# Altium integrated library OMID_DXP_LIB93.IntLib: 684 symbols (part 1 of 5)
Pins are listed as number, name and electrical type; pins without a type are passive.

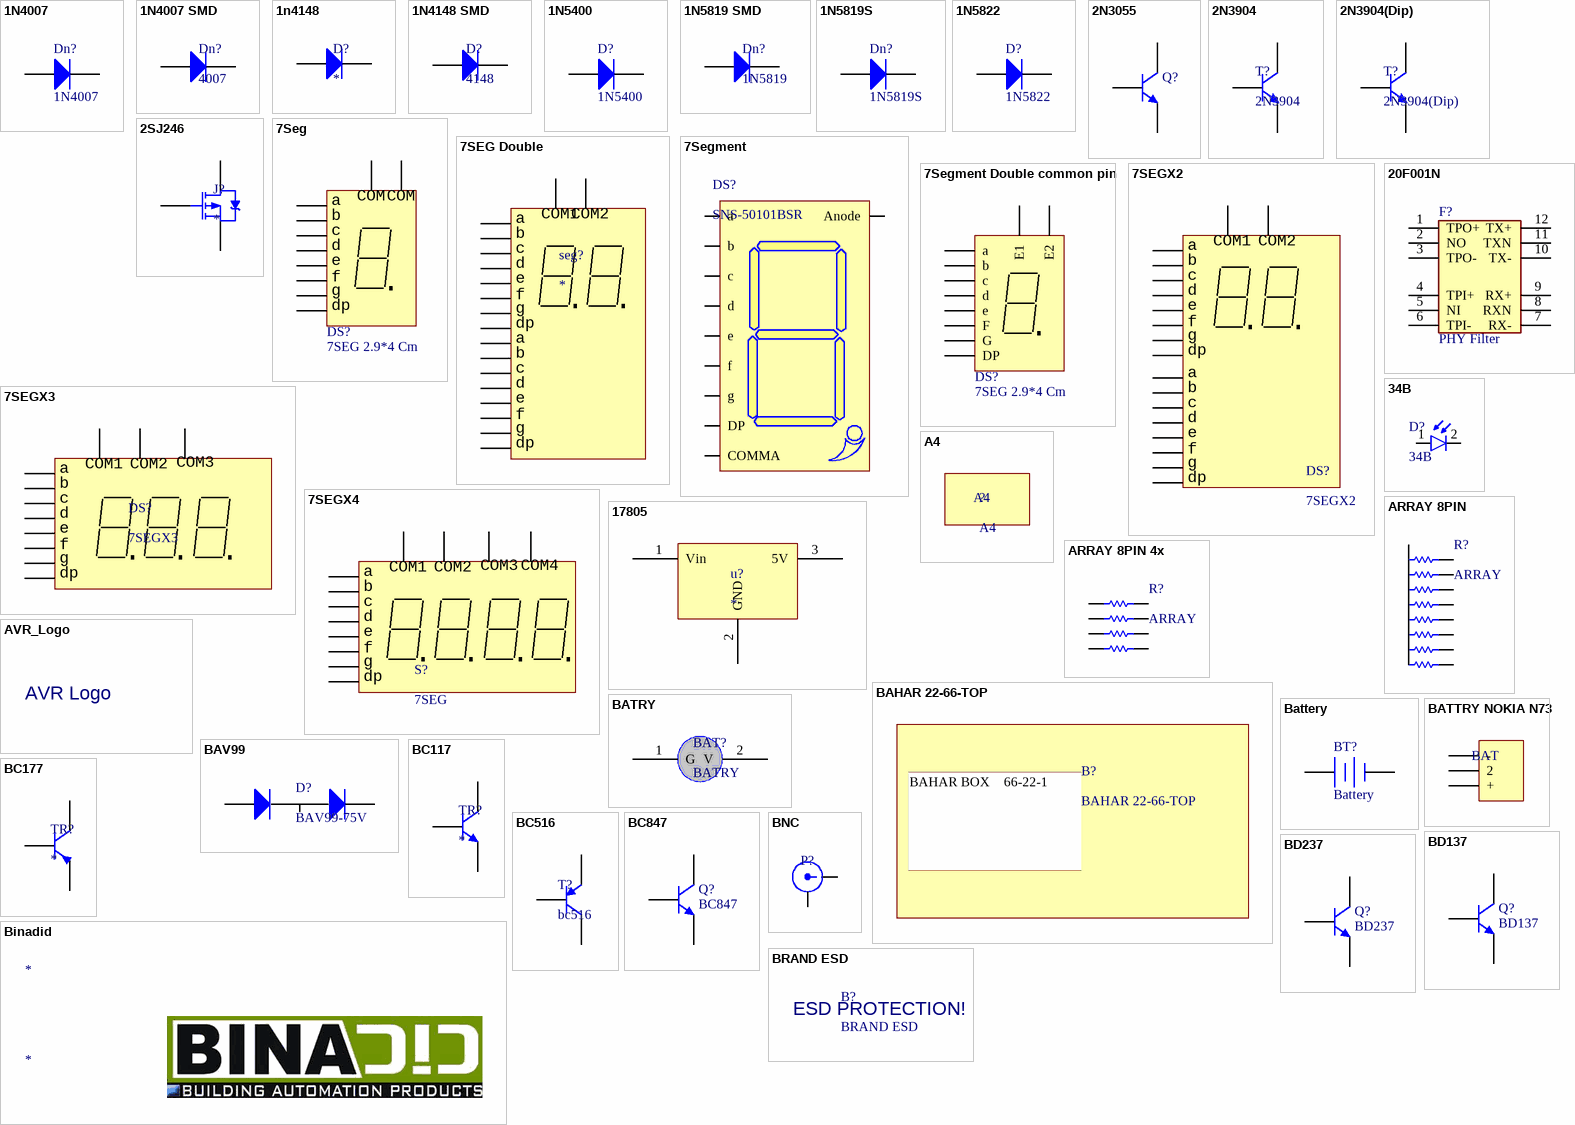
[diagram p0: symbols 1N4007 to BRAND ESD]

## 1N4007
designator Dn?
1 Amp Diode
footprint my_1n4148
footprint Diode 1N4007_Stand
footprint Diode-1n4001
pins: 1 A, 2 K

## 1N4007 SMD
designator Dn?, comment 4007
footprint my_smd_diode
footprint LL4148 (MELF Diode, 2-Leads, Body 3.5x1.4mm, IPC Medium Density)
footprint DO-214AB
footprint DO-214AA
pins: 1 A, 2 K

## 1n4148
designator D?
FAST DIODE
footprint DO-35 (Diode, Axial; Body 3.8 x 1.9 mm (LxDia. max), Lead Dia. 0.53 mm (max))
footprint DIO10.2-7x2.7 (Diode, Axial; Body 7 x 2.7 mm (LxDia. max), Lead Dia. 0.53 mm (max))
footprint Diode 1W_Stand
footprint Diode-1n4148-Stand
pins: 1 A, 2 K

## 1N4148 SMD
designator D?, comment 4148
FAST DIODE (SMD PACKAGE) 1N4148
footprint SOD80 (SOD80 SMD PACKAGE)
footprint LL4148 (MELF Diode, 2-Leads, Body 3.5x1.4mm, IPC Medium Density)
pins: 1 A, 2 K

## 1N5400
designator D?
3 Amp Diode
footprint My_DO201-15
pins: A, K

## 1N5819 SMD
designator Dn?, comment 1N5819
VERY FAST DIODE
footprint my_smd_diode
pins: 1 A, 2 K

## 1N5819S
designator Dn?
VERY FAST 1 AMP DIODE
footprint my_1n4148
footprint Diode 1N4007_Stand
footprint Diode-1n4001
pins: 1 A, 2 K

## 1N5822
designator D?
3 Amp Diode
footprint My_DO201-15
pins: A, K

## 2N3055
designator Q?
Complementary Silicon Power NPN Transistor, 15 Amp, 60 Volts and 115 Watts; Published: 19-Mar-2004; DatasheetVersion: 1984; PackageVersion: Rev.3, 1984; PackageReference: 11-01; Publisher: Altium Limited; PackageDescription: Oval Flange Mount with (2) Offset Leads; Pin Spacing 10.93 mm; Lead Dia. 1.09 mm (max); Code_JEDEC: TO-3; ComponentLink1Description: Manufacturer Link; ComponentLink1URL: http://www.onsemi.com/site/products/landing?taxonomyID=194
footprint 11-01 (Oval Flange Mount with (2) Offset Leads; Pin Spacing 10.93 mm; Lead Dia. 1.09 mm (max))
signal-integrity model 2N3055
pins: 1 B, 2 E, 3 C

## 2N3904
designator T?
footprint SOT23_BEC_N (SOT23, 3-Leads, Body 2.9x1.3mm, Pitch 0.95mm, Lead Span 2.4mm, IPC Medium Density)
footprint SOT23_BEC_L (SOT23, 3-Leads, Body 2.9x1.3mm, Pitch 0.95mm, Lead Span 2.4mm, IPC High Density)
footprint SOT23_BEC_M (SOT23, 3-Leads, Body 2.9x1.3mm, Pitch 0.95mm, Lead Span 2.4mm, IPC Low Density)
pins: 1 B, 2 E, 3 C

## 2N3904(Dip)
designator T?
footprint my_tr
pins: 1 E, 2 C, 3 B

## 2SJ246
designator J?
footprint my_smd_lf33
pins: 1 G, 2 D, 3 S

## 7Seg
designator DS?, comment 7SEG 2.9*4 Cm
Common Anode Seven-Segment Display, Right Hand Decimal; Manufacturer: Generic Components; Class: Optoelectronic; SubClass: LED Display; Published: 08/06/2000; Publisher: Altium Hobart Technology Centre
footprint My_7 seg_BIG
footprint 7Segment
footprint 7SEGMENT_MEDIUM
pins: 1 COM (power), 2 e, 3 d, 4 c, 5 COM (power), 6 b, 7 a, 8 dp, 9 f, 10 g

## 7SEG Double
designator seg?
footprint my_7seg_double
pins: 1 f, 2 g, 3 a, 4 b, 5 COM1 (power), 6 COM2 (power), 7 f, 8 a, 9 b, 10 e, 11 d, 12 c, 13 dp, 14 e, 15 d, 16 g, 17 c, 18 dp

## 7Segment
designator DS?, comment SNS-50101BSR
footprint 7Segment
pins: 1 e, 2 d, 3 COMMA, 4 DP, 5 c, 6 b, 7 a, 8 Anode, 9 g, 10 f

## 7Segment Double common pin
designator DS?, comment 7SEG 2.9*4 Cm
Common Anode Seven-Segment Display, Right Hand Decimal; Manufacturer: Generic Components; Class: Optoelectronic; SubClass: LED Display; Published: 08/06/2000; Publisher: Altium Hobart Technology Centre
footprint 7segx2 COMMON PIN (cuade 7seg in 1 package)
pins: 1 d, 2 DP, 3 e, 4 c, 5 E2 (power), 6 b, 7 a, 8 F, 9 G, 10 E1 (power)

## 7SEGX2
designator DS?
LITE ON COMPANY 7SEGMENT NUMERIC LED DISPLAY
footprint 7segx2 (cuade 7seg in 1 package)
pins: 1 e, 2 d, 3 c, 4 dp, 5 e, 6 d, 7 g, 8, 9 dp, 10 b, 11 a, 12 f, 13 COM2 (power), 14 COM1 (power), 15 b, 16 a, 17 g, 18 f

## 7SEGX3
designator DS?
LITE ON COMPANY 7SEGMENT NUMERIC LED DISPLAY
footprint 7SEGX3
pins: 1 e, 2 d, 3 dp, 4 c, 5 g, 7 b, 8 COM1 (power), 9 COM2 (power), 10 f, 11 a, 12 COM1 (power)
text: COM3

## 7SEGX4
designator S?, comment 7SEG
LITE ON COMPANY 7SEGMENT NUMERIC LED DISPLAY
footprint 7SEGX4
pins: 1 e, 2 d, 3 dp, 4 c, 5 g, 6 COM2 (power), 7 b, 8 COM1 (power), 9 COM2 (power), 10 f, 11 a, 12 COM1 (power)
text: COM3; COM4

## 20F001N
designator F?, comment PHY Filter
footprint MY_20F001N
pins: 1 TPO+, 2 NO, 3 TPO-, 4 TPI+, 5 NI, 6 TPI-, 7 RX-, 8 RXN, 9 RX+, 10 TX-, 11 TXN, 12 TX+

## 34B
designator D?
Photodiode; Designer: Saeid Jorablo; Company: Personal; Project Name: Laser; Adding Date: 10/21/2009
footprint 34b
pins: 1 A, 2 K

## 17805
designator u?
5 V 1 AMPER (LONG INPUT BANDWITH)
footprint my_smd_lf33
footprint my_7805
pins: 1 Vin (power), 2 GND (power), 3 5V (power)

## A4
designator ?
A4 PAPAR SIZE
footprint A4

## ARRAY 8PIN
designator R?, comment ARRAY
8 PIN ARRAY RESISTOR; VALUE?: 47K
footprint MY1X9
pins: 1, 2, 3, 4, 5, 6, 7, 8, 9

## ARRAY 8PIN 4x
designator R?, comment ARRAY
8 PIN ARRAY RESISTOR; VALUE?: 47K
footprint Res Array 0603X4 3.2mmX1.6mm
footprint RES ARRAY 1206
pins: 1, 2, 3, 4, 5, 6, 7, 8

## AVR_Logo
designator U?, comment AVR logo
footprint MY_AVR_LOGo_1
footprint MY_AVR_LOGo_5
footprint MY_AVR_LOGo_4
footprint MY_AVR_LOGo_3
footprint MY_AVR_LOGo_2
footprint MY_AVR_LOG*1
footprint my_avr_logo_top
text: AVR Logo

## BAHAR 22-66-TOP
designator B?
BAHAR BOX 22-66/1 PART1
footprint BAHAR22-66/1-TOP
text: BAHAR BOX    66-22-1 /

## BATRY
designator BAT?
BATTRY HOLDER
footprint MY_BATRY
footprint BATTRY SMD
pins: 1 G, 2 V

## Battery
designator BT?
Multicell Battery; Published: 24-Mar-1999; LatestRevisionDate: 17-Jul-2002; LatestRevisionNote: Re-released for DXP Platform.; PackageReference: BAT-2; Publisher: Altium Limited
footprint BAT-2 (Multicell Battery; 2 Leads)
footprint header_small_2
pins: 1 +, 2 -

## BATTRY NOKIA N73
designator BAT, comment BAT  (value not drawn)
N73 BATTRY SOCKET + BATTRY 1100mAH 3.7V 4.1WH
footprint BATTRY_N73 (N73 MOBILE BATTRY SOCKET)
pins: 1 -, 2, 3 +

## BAV99
designator D?, comment BAV99-75V
Dual Series  Switching Diode; VALUE: BAV99-75V
footprint SOT-23 (SOT-23; 3 Leads; Body 3.0 x 2.6 mm, inc. leads (LxW max))
pins: B, C, E

## BC117
designator TR?
footprint my_tr iron
pins: 1 B, 2 C, 3 E

## BC177
designator TR?
footprint my_tr iron
pins: 1 B, 2 C, 3 E

## BC516
designator T?, comment bc516
footprint my_tr
pins: 1 C, 2 E, 3 B

## BC847
designator Q?
Darlington transistor
footprint SOT23_BEC_L (SOT23, 3-Leads, Body 2.9x1.3mm, Pitch 0.95mm, Lead Span 2.4mm, IPC High Density)
pins: 1 B, 2 E, 3 C

## BD137
designator Q?
Darlington transistor
footprint My_TO126
footprint SOT-23 (SOT-23; 3 Leads; Body 3.0 x 2.6 mm, inc. leads (LxW max))
pins: B, C, E

## BD237
designator Q?
Silicon Npn Epitaxial Base Power Transistor ; Nf-L, 60V, 2A, 25W, 3MHz
footprint My_TO126
footprint SOT-23 (SOT-23; 3 Leads; Body 3.0 x 2.6 mm, inc. leads (LxW max))
pins: B, C, E

## Binadid
designator *
Logo
footprint Binadid

## BNC
designator P?  (value not drawn)
BNC Socket, PCB Mounted; designer: Saeid Jorablo; Company: ACR; Signal Name: *; adding date: 2009-12-19
footprint BNC - Connector
footprint BNC - Complex
pins: 1, 2

## BRAND ESD
designator B?
TOP OVERLAY BRAND
footprint BRAND_ESD
footprint BRAND_ESD_SMALL
text: ESD PROTECTION!

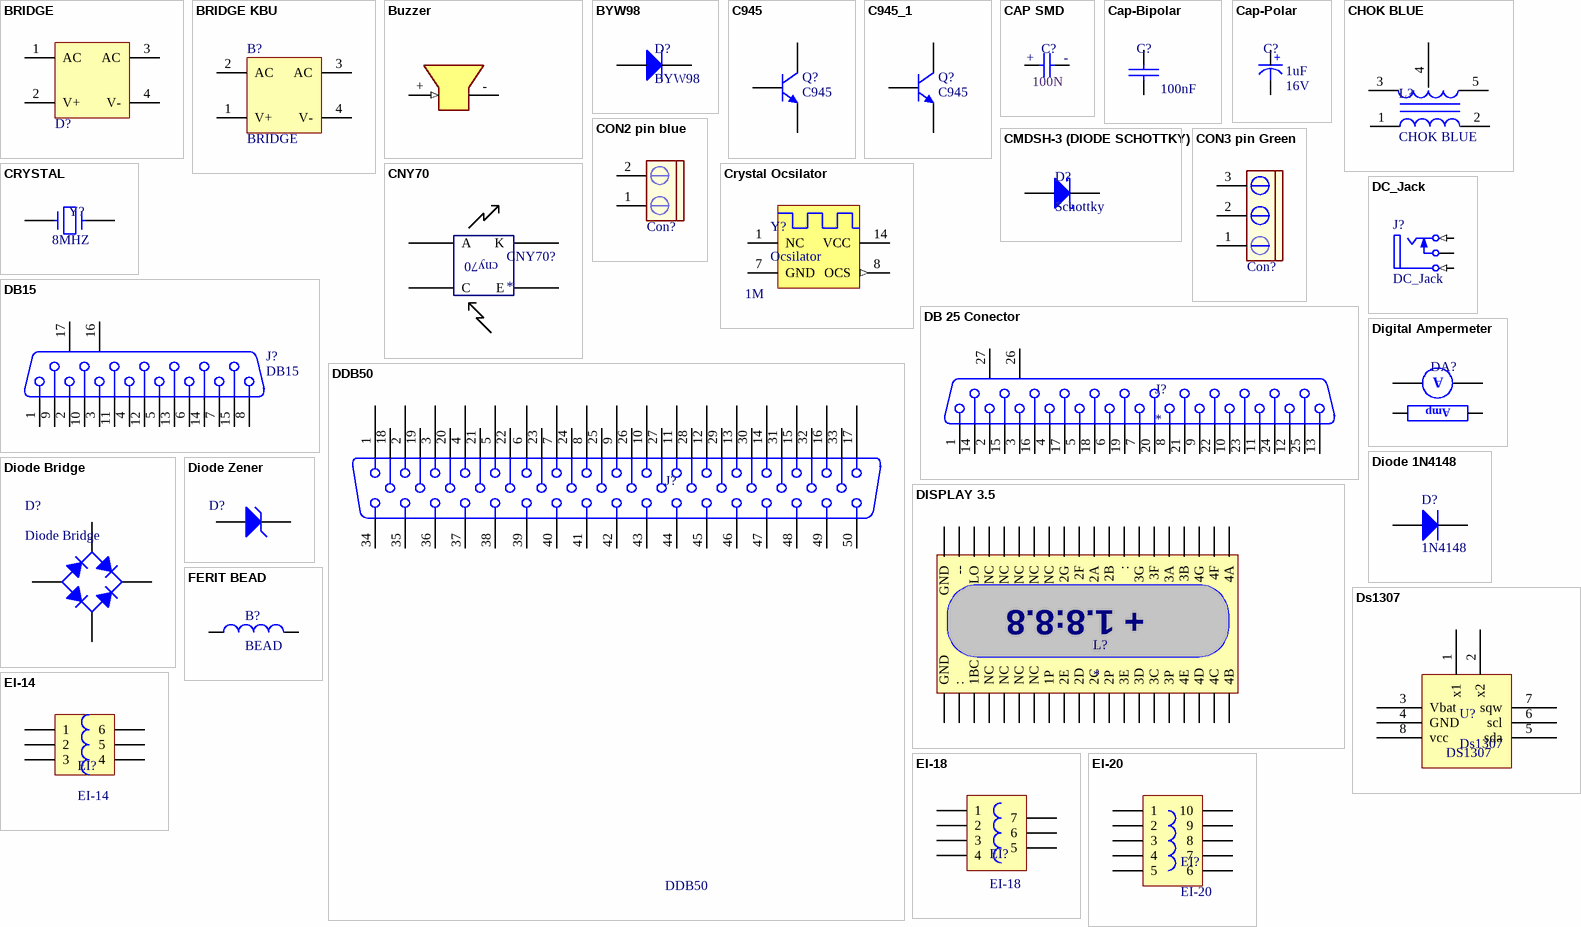
[diagram p1: symbols BRIDGE to FERIT BEAD]

## BRIDGE
designator D?  (value not drawn)
Diode Bridge 1 Amp
footprint Bridge 3A
footprint Bridge 1A
footprint BRIDGE 1A CIRCULE
footprint Bridge DF0X
pins: 1 AC, 2 V+, 3 AC, 4 V-

## BRIDGE KBU
designator B?, comment BRIDGE
BRIDGE KBU 6 Amp
footprint My_KBU
pins: 1 V+ (power), 2 AC, 3 AC, 4 V- (power)

## Buzzer
designator U?
5-12v small buzzer (12mm)
footprint My_Buzzer
footprint BUZZER SMD (PART NUMBER DB SDT 0833C 2/49)
pins: + 1 (in), - 2

## BYW98
designator D?
HIGH EFFICIENCY FAST RECOVERY RECTIFIER DIODES; Designer: Saeid Jorablo; Company: ControTEK; IF(av): 3 A; Vrrm: 200 V; Trr (max): 35 ns; Adding Date: 1387/01/10
footprint BYW98
pins: 1 A, 2 K

## C945
designator Q?
Darlington transistor
footprint SOT-23 (SOT-23; 3 Leads; Body 3.0 x 2.6 mm, inc. leads (LxW max))
pins: B, C, E

## C945_1
designator Q?, comment C945
NPN Transistor; Designer: Saeid Jorablo; Company: IPA CO; Last Update Time: 2008/08/04; Value: C945
footprint C945 (NPN Transistor Footprint)
pins: 1 E, 2 C, 3 B

## CAP SMD
designator C?, comment 100N
1206 SIZE SMD CAPASITOR; VALUE: 100N
footprint MY_SMD_R & C
footprint my_smd_cap- 10uf
footprint 14-1210 (Chip Resistor; Body 3.2 x 2.5 mm (LxW typ))
footprint 8-1206 (Chip Resistor; Body 3.1 x 1.6 mm (LxW typ))
footprint 0805 (Chip Capacitor; Body 2.0 x 1.2 mm (LxW typ))
footprint CAP 1206 (3216X15L) (Chip Capacitor, 2-Leads, Body 3.2x1.6mm, IPC High Density)
footprint CAP-F (83x83mm)
footprint CAP-B (83x83mm)
footprint CAP-F 10x10 (83x83mm)
pins: 1, 2
text: +; -

## Cap-Bipolar
designator C?, comment 100nF
Bipolar Capacitor; Voltage: 100V; Designer: Saeid Jorablo; Organazation: ControTec; Adding Date: 1387/12/20; Value: 100nF
footprint Cap 1uF-400v-Right
footprint Cap 1uF-400V-Stand
footprint Cap 10nF
footprint Cap - 100nF
footprint Cap - 100nF - 2
footprint Cap_680nF
footprint CAP 1206 (3216X15L) (Chip Capacitor, 2-Leads, Body 3.2x1.6mm, IPC High Density)
footprint CAPP 1206 (3216X18L) Size A (Chip Capacitor, 2-Leads, Body 3.2x1.6mm, IPC High Density, chip Tantalum)
footprint Cap - 10nF - 630V
footprint Cap - 100nF - 400V
footprint Cap - 220n - 400V - Poly
footprint Cap - 330nF - 400V
footprint SMD_CAP_0603
footprint SMD_CAP_0805
footprint SMD_CAP_1206
pins: 1 +, 2 -

## Cap-Polar
designator C?, comment Voltage: 16V  (hidden comment: 1uF)
Polar Capacitor; Designer: Saeid Jorablo; Organazation: ControTec; Adding Date: 1387/12/20; Value: 1uF
footprint cap 00
footprint cap 01
footprint cap 02
footprint cap 03
footprint cap 04
footprint CAP 05
footprint CAPP 1206 (3216X18L) Size A (Chip Capacitor, 2-Leads, Body 3.2x1.6mm, IPC High Density, chip Tantalum)
pins: 1 +, 2 -

## CHOK BLUE
designator L?
Magnetic-Core Inductor; Published: 24-Mar-1999; LatestRevisionDate: 17-Jul-2002; LatestRevisionNote: Re-released for DXP Platform.; PackageReference: AXIAL-0.9; Publisher: Altium Limited; PackageDescription: Axial Device, Thru-Hole; 2 Leads; 0.9 in Pin Spacing
footprint chok_blue
pins: 1, 2, 3, 4, 5

## CMDSH-3 (DIODE SCHOTTKY)
designator D?, comment Schottky
silicon Schottky diode
footprint SOD-323
footprint Diode 1206
footprint DSO-C2/X2.3 (DO-214-AA/SMB; 2 C-Bend Leads; Body 5.3 x 3.6 mm, inc. leads (LxW))
pins: 1 A, 2 K

## CNY70
designator CNY70?
SEND AND RECIVER IR SENSOR
footprint my_cny70
pins: 1 K, 2 A, 3 E, 4 C
text: cny70

## CON2 pin blue
designator Con?  (value not drawn)
Connector blue screw
footprint My_CN2
footprint Socket Blue 2
pins: 1, 2

## CON3 pin Green
designator Con?  (value not drawn)
Connector green screw
footprint My_CN3
footprint Socket Blue 3
pins: 1, 2, 3

## CRYSTAL
designator Y?, comment 8MHZ
Crystal; BY: OMID HABIBI; UPDATE TIME: 94/3/28; PACKAGE: SMD LPC-3; VALUE: 8MHZ
footprint My_Crystal
footprint Crystal SMD
pins: 1, 2

## Crystal Ocsilator
designator Y?, comment Ocsilator  value 1M
Crystal Ocsilator; Designer: Saeid Jorablo; Organazation: ControTec; Adding Date: 1387/12/22; ComponentLink1Description: Datasheet; ComponentLink1URL: http://scrltd.co.il/admin/products/technicalFile/SCO-020.pdf
footprint OCS
signal-integrity model Model Name (Model Description)
pins: 1 NC, 7 GND (power), 8 OCS (out), 14 VCC (power)

## DB15
designator J?
Receptacle Assembly, 15 Position, Right Angle; PackageDocument: O; Positions: 15; Published: 15-Jun-2001; LatestRevisionDate: 17-Jul-2002; LatestRevisionNote: Re-released for DXP Platform.; DatasheetDocument: 1-Sep-99; PackageReference: 788757; Publisher: Altium Limited; Orientation: Right Angle; Gender: Receptacle
footprint DSUB1.385-2H15 (Connector; D Subminiature; 15 Position; Right Angle; Pitch 1.385 mm)
signal-integrity model Connector
pins: 1, 2, 3, 4, 5, 6, 7, 8, 9, 10, 11, 12, 13, 14, 15, 16 MH1, 17 MH2

## DB 25 Conector
designator J?
footprint my_Db25
pins: 1, 2, 3, 4, 5, 6, 7, 8, 9, 10, 11, 12, 13, 14, 15, 16, 17, 18, 19, 20, 21, 22, 23, 24, 25, 26 MH1, 27 MH2

## DC_Jack
designator J?
ON BOARD DC JACK FMAILE RIGHT ANGLE; PackageDocument: 2003; PCB_Layout: Complies with manufacturer's recommendation.; DrillAndSlotSize: Corresponds to nominal value.; LatestRevisionDate: 15-Jul-2004; LatestRevisionNote: Component Replaced & renamed from "Phonejack".; DatasheetDocument: 2003; PackageReference: S1VS_SNB; Publisher: Altium Limited; ComponentLink1Description: Manufacturer Link; ComponentLink1URL: http://www.cliffuk.co.uk/
footprint My_DC_Jack
signal-integrity model JACK Socket
footprint Power Jack (Power Adaptor Jack)
pins: 1 T (in) "Tip", 2 TN "Tip Normal (Break Contact)", 3 S (in) "Sleeve (Ground)"

## DDB50
designator J?
50-Pin Edge Connector; LatestRevisionDate: 17-Jul-2002; LatestRevisionNote: Re-released for DXP Platform.; Publisher: Altium Limited
signal-integrity model Connector
footprint DDB50
pins: 1, 2, 3, 4, 5, 6, 7, 8, 9, 10, 11, 12, 13, 14, 15, 16, 17, 18, 19, 20, 21, 22, 23, 24, 25, 26, 27, 28, 29, 30, 31, 32, 33, 34, 35, 36, 37, 38, 39, 40, 41, 42, 43, 44, 45, 46, 47, 48, 49, 50

## Digital Ampermeter
designator DA?  (value not drawn)
Designer: Saeid Jorablo; Company: ControTec; Adding Date: 1387/12/24
footprint HEADER 4X1 (Footprint not found)
pins: 1 I+, 2 I-, 3 GND, 4 VCC
text: A; Amp

## Diode 1N4148
designator D?, comment 1N4148
High Conductance Fast Diode; Published: 8-Jun-2000; LatestRevisionDate: 17-Jul-2002; LatestRevisionNote: Re-released for DXP Platform.; DatasheetVersion: 1997; PackageReference: DO-35; Publisher: Altium Limited; PackageDescription: Diode, Axial; Body 3.8 x 1.9 mm (LxDia. max), Lead Dia. 0.53 mm (max); Code_JEDEC: DO-204-AH; ComponentLink1Description: Manufacturer Link; ComponentLink1URL: http://www.fairchildsemi.com/; ComponentLink2Description: Datasheet; ComponentLink2URL: http://www.fairchildsemi.com/ds/1N%2F1N4148.pdf
footprint DO-35 (Diode, Axial; Body 3.8 x 1.9 mm (LxDia. max), Lead Dia. 0.53 mm (max))
signal-integrity model 1N4148
footprint LL4148 (MELF Diode, 2-Leads, Body 3.5x1.4mm, IPC Medium Density)
pins: 1 A, 2 K

## Diode Bridge
designator D?
Full Wave Diode Bridge; Company: E.P.I.L; Design Date: 2011/11/02
footprint Bridge
footprint Diode Bridge
pins: 1 K, 2 C, 3 A, 4 C

## Diode Zener
designator D?  (value not drawn)
Zener Diode; Designer: Saeid Jorablo; Company: E.P.I.L; Voltage: 3.3 V; Design Date: 2011/11/02
footprint Diode 1W
footprint Diode 1W_Stand
pins: 1 A, 2 K

## DISPLAY 3.5
designator L?
3.5 DIGITAL DISPLAY WITH 2 DRIVER
footprint DISPLAY 3.5
pins: 1 GND, 2 :, 3 1BC, 4 NC, 5 NC, 6 NC, 7 NC, 8 1P, 9 2E, 10 2D, 11 2C, 12 2P, 13 3E, 14 3D, 15 3C, 16 3P, 17 4E, 18 4D, 19 4C, 20 4B, 21 4A, 22 4F, 23 4G, 24 3B, 25 3A, 26 3F, 27 3G, 28 :, 29 2B, 30 2A, 31 2F, 32 2G, 33 NC, 34 NC, 35 NC, 36 NC, 37 NC, 38 LO, 39 --, 40 GND
text: + 1.8:8.8

## Ds1307
designator U?
RTC IC
footprint DIP8
pins: 1 x1, 2 x2, 3 Vbat, 4 GND, 5 sda, 6 scl, 7 sqw, 8 vcc
text: DS1307

## EI-14
designator EI?
EI 14 TRANSE SWITCHING
footprint EI-14
footprint EI-12
pins: 1, 2, 3, 4, 5, 6

## EI-18
designator EI?
EI18 TRANSE SWITCHING
footprint EI-18
pins: 1, 2, 3, 4, 5, 6, 7

## EI-20
designator EI?
EI 20 TRANSE SWITCHING
footprint EI22
pins: 1, 2, 3, 4, 5, 6, 7, 8, 9, 10

## FERIT BEAD
designator B?, comment BEAD
FERIT BEAD SMD 1206
footprint MY_SMD_R & C
footprint 1206 (Chip Capacitor; Body 3.2 x 1.6 mm (LxW typ))
footprint RES 1206 (3216X08L) (Chip Resistor, 2-Leads, Body 3.2x1.6mm, IPC High Density _ (0.125 W))
footprint RES 0805 (2012X06L) (Chip Resistor, 2-Leads, Body 2.0x1.3mm, IPC High Density _ (0.100 W))
pins: 1, 2

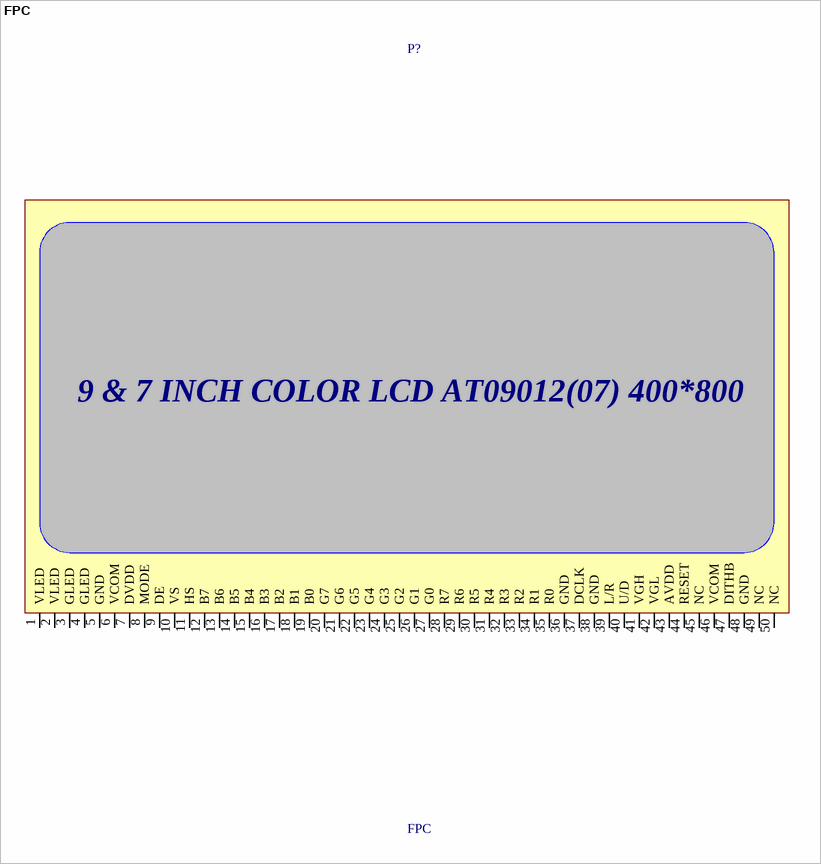
[diagram p2: symbol FPC]

## FPC
designator P?
footprint FPC 7
pins: 1 VLED, 2 VLED, 3 GLED, 4 GLED, 5 GND, 6 VCOM, 7 DVDD, 8 MODE, 9 DE, 10 VS, 11 HS, 12 B7, 13 B6, 14 B5, 15 B4, 16 B3, 17 B2, 18 B1, 19 B0, 20 G7, 21 G6, 22 G5, 23 G4, 24 G3, 25 G2, 26 G1, 27 G0, 28 R7, 29 R6, 30 R5, 31 R4, 32 R3, 33 R2, 34 R1, 35 R0, 36 GND, 37 DCLK, 38 GND, 39 L/R, 40 U/D, 41 VGH, 42 VGL, 43 AVDD, 44 RESET, 45 NC, 46 VCOM, 47 DITHB, 48 GND, 49 NC, 50 NC
text: 9 & 7 INCH COLOR LCD AT09012(07) 400*800

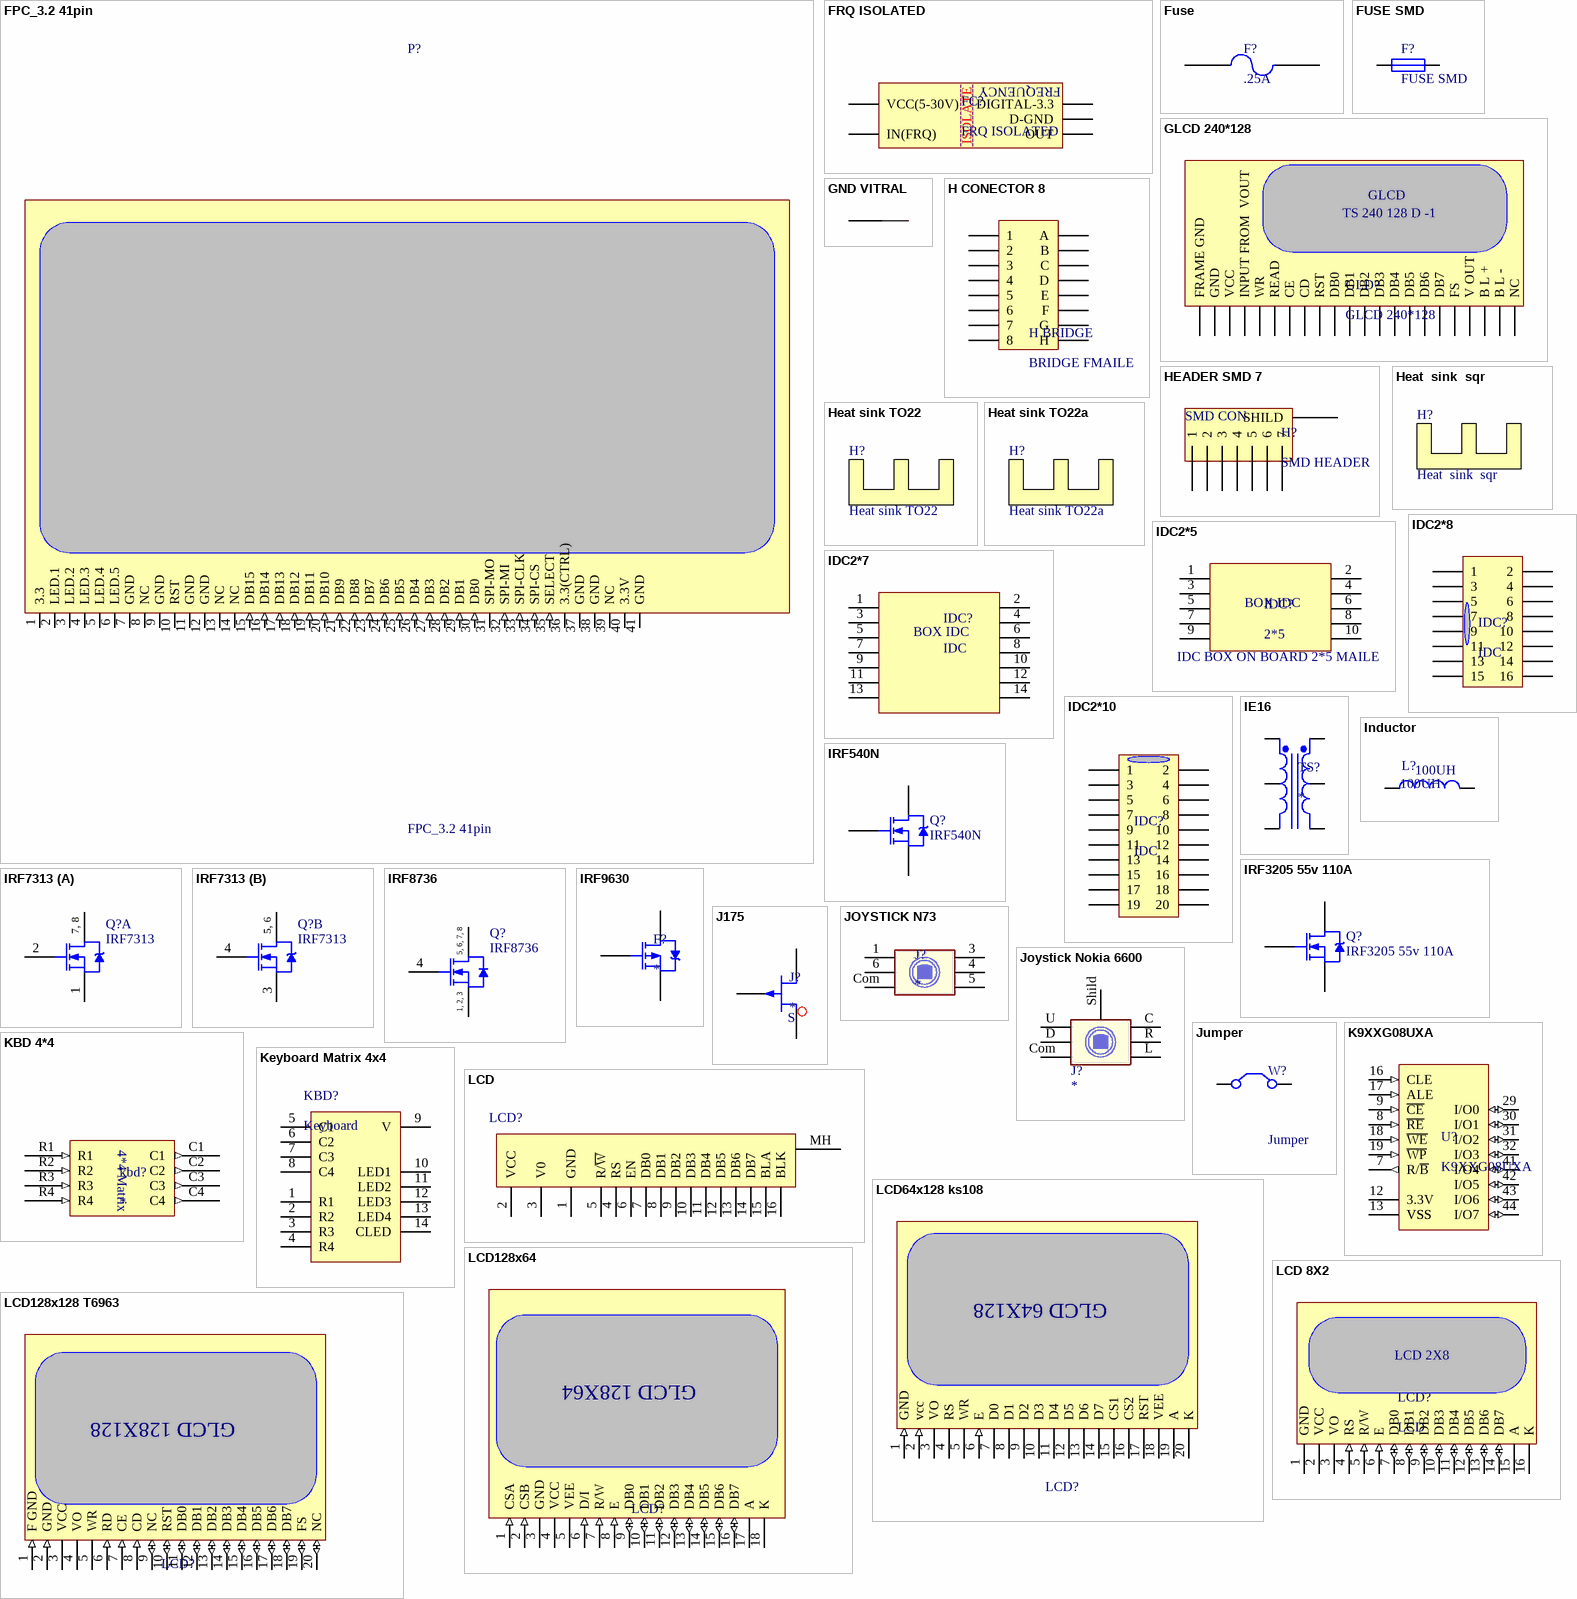
[diagram p3: symbols FPC_3.2 41pin to LCD 8X2]

## FPC_3.2 41pin
designator P?
0.3 mm Pitch, 1.0 mm Height FPC Connector
footprint FPC 3.2 FH26w41S
pins: 1 3.3, 2 LED.1, 3 LED.2, 4 LED.3, 5 LED.4, 6 LED.5, 7 GND, 8 NC, 9 GND, 10 RST, 11 GND, 12 GND, 13 NC, 14 NC, 15 DB15 (in), 16 DB14 (in), 17 DB13 (in), 18 DB12 (in), 19 DB11 (in), 20 DB10 (in), 21 DB9 (in), 22 DB8 (in), 23 DB7 (in), 24 DB6 (in), 25 DB5 (in), 26 DB4 (in), 27 DB3 (in), 28 DB2 (in), 29 DB1 (in), 30 DB0 (in), 31 SPI-MO, 32 SPI-MI (in), 33 SPI-CLK (in), 34 SPI-CS (in), 35 SELECT (in), 36 3.3(CTRL), 37 GND, 38 GND, 39 NC, 40 3.3V, 41 GND

## FRQ ISOLATED
designator FC?
FRQ ISOLATION(4N37-390R-3904-LED-220R-120R)
footprint FRQ_ISOLATION
pins: 5V VCC(5-30V), F_OUT OUT, GND-3V3 D-GND, IN IN(FRQ), VCC-3V3 DIGITAL-3.3
text: FREQUENCY; --------------; ISOLATE

## Fuse
designator F?, comment .25A
FUSE CONTROL; AMPER: .25A
footprint my_fuse
footprint 1206 (Chip Capacitor; Body 3.2 x 1.6 mm (LxW typ))
footprint 0805 (Chip Capacitor; Body 2.0 x 1.2 mm (LxW typ))
footprint Fuse - Complex
footprint Fuse_resistor
footprint Fuse-Single Pad
footprint FUSE-Double PAD
pins: 1, 2

## FUSE SMD
designator F?
SMD FUSE
footprint 8-1206 (Chip Resistor; Body 3.1 x 1.6 mm (LxW typ))
footprint INDC1608L (Chip Inductor, Body 1.6x0.8mm, IPC High Density)
footprint CAP 1206 (3216X15L) (Chip Capacitor, 2-Leads, Body 3.2x1.6mm, IPC High Density)
pins: 1, 2

## GLCD 240*128
designator GLD?
footprint GLCD_240_128D
footprint MY_1X22
footprint MY_2X11
pins: 1 FRAME GND, 2 GND, 3 VCC, 4 INPUT FROM  VOUT, 5 WR, 6 READ, 7 CE, 8 CD, 9 RST, 10 DB0, 11 DB1, 12 DB2, 13 DB3, 14 DB4, 15 DB5, 16 DB6, 17 DB7, 18 FS, 19 V OUT, 20 B L +, 21 B L -, 22 NC
text: GLCD; TS 240 128 D -1

## GND VITRAL
designator GND_?, comment VITRUAL GRAND  (value not drawn)
THIS IS NOT COMPONNENT
footprint GND_VITRUAL
pins: 1, 2

## H CONECTOR 8
designator H BRIDGE, comment BRIDGE FMAILE
footprint 2X8 H_BRIDGE
pins: 1, 2, 3, 4, 5, 6, 7, 8, A, B, C, D, E, F, G, H

## HEADER SMD 7
designator H?, comment SMD HEADER
footprint HEADER_SMD
pins: 0 SHILD, 1, 2, 3, 4, 5, 6, 7
text: SMD CON

## Heat  sink  sqr
designator H?
Heat sink sqr
footprint My_Heat_sink_sqr

## Heat sink TO22
designator H?
Heat sink for TO22
footprint My_Heat_sink_TO22

## Heat sink TO22a
designator H?
Heat sink for TO22
footprint My_Heat_sink_TO22a

## IDC2*5
designator IDC?, comment 2*5
IDC BOX ON BOARD MAILE
footprint MY_ISP_PROG
footprint IDC2*5 RIGHT (IDC 2*5 RIGHT ANGLE MAILE)
pins: 1, 2, 3, 4, 5, 6, 7, 8, 9, 10
text: BOX IDC; IDC BOX ON BOARD 2*5 MAILE

## IDC2*7
designator IDC?, comment IDC
IDC BOX ON BOARD MAILE
footprint IDC2*7
pins: 1, 2, 3, 4, 5, 6, 7, 8, 9, 10, 11, 12, 13, 14
text: BOX IDC

## IDC2*8
designator IDC?, comment IDC
IDC BOX ON BOARD MAILE
footprint IDC16 - 2*8
pins: 1, 2, 3, 4, 5, 6, 7, 8, 9, 10, 11, 12, 13, 14, 15, 16

## IDC2*10
designator IDC?, comment IDC
IDC BOX ON BOARD MAILE
footprint IDC2*10
pins: 1, 2, 3, 4, 5, 6, 7, 8, 9, 10, 11, 12, 13, 14, 15, 16, 17, 18, 19, 20

## IE16
designator TS?
IE CORE
footprint my_iE16
pins: 1 Pri+, 2 PriCT, 3 Pri-, 4 Sec+, 5 SecCT, 6 Sec-

## Inductor
designator L?, comment 100UH
Inductor; Code_IEC: 1005; Published: 8-Jun-2000; LatestRevisionDate: 29-May-2009; LatestRevisionNote: IPC-7351 Footprint Added.; PackageReference: 0402-A; Publisher: Altium Limited; PackageDescription: Chip Inductor; Code_JEITA: 0402; Value: 100UH
footprint 0402-A (Chip Inductor, Body 1.0x0.5mm, IPC High Density)
footprint INDC1608L (Chip Inductor, Body 1.6x0.8mm, IPC High Density)
footprint 2029 (Chip Inductor, Body 2.0x1.2mm, IPC High Density)
footprint 0603 (Chip Inductor, Body 0.6x0.3mm, IPC High Density)
footprint INDC3216 (Chip Inductor, Body 3.2x1.6mm, IPC High Density)
footprint INDC4532 (Chip Inductor, Body 4.5x3.2mm, IPC High Density)
signal-integrity model Inductor
footprint 6-0805_M (Chip Resistor, Body 2.0x1.2mm, IPC Low Density)
footprint 6-0805_N (Chip Resistor, Body 2.0x1.2mm, IPC Medium Density)
footprint 6-0805_N (Chip Resistor, Body 2.0x1.2mm, IPC Medium Density)
footprint L-smd
footprint L-4R7-smd
footprint INDC 3A 12-12-7 (Chip Inductor, Body 4.5x3.2mm, IPC High Density)
pins: 1, 2

## IRF540N
designator Q?
HEXFET Power MOSFET; Note: Pin 2 is electrically connected to pin 4.; Sim Note: Thermal Model provided is not called on from main Subckt.; Published: 8-Jun-2000; LatestRevisionDate: 17-Jul-2002; LatestRevisionNote: Re-released for DXP Platform.; DatasheetVersion: May-1998; PackageVersion: Feb-1997; PackageReference: TO-220AB; Publisher: Altium Limited; PackageDescription: TO, Thru-Hole, Vertical, Heatsink Mounted; 3 In-Line Leads; Pitch 2.54 mm; ComponentLink1Description: Manufacturer Link; ComponentLink1URL: http://www.irf.com/; ComponentLink2Description: Datasheet; ComponentLink2URL: http://www.irf.com/product-info/datasheets/data/irf540n.pdf
footprint TO-220AB (TO, Thru-Hole, Vertical, Heatsink Mounted; 3 In-Line Leads; Pitch 2.54 mm)
pins: 1 G, 2 D, 3 S

## IRF3205 55v 110A
designator Q?
TO PACKAGE 55v 110A; Note: Pin 2 is electrically connected to pin 4.; Sim Note: Thermal Model provided is not called on from main Subckt.; Published: 8-Jun-2000; LatestRevisionDate: 17-Jul-2002; LatestRevisionNote: Re-released for DXP Platform.; DatasheetVersion: May-1998; PackageVersion: Feb-1997; PackageReference: TO-220AB; Publisher: Altium Limited; PackageDescription: TO, Thru-Hole, Vertical, Heatsink Mounted; 3 In-Line Leads; Pitch 2.54 mm; ComponentLink1Description: Manufacturer Link; ComponentLink1URL: http://www.irf.com/; ComponentLink2Description: Datasheet; ComponentLink2URL: http://www.irf.com/product-info/datasheets/data/irf540n.pdf
footprint TO-220AB (TO, Thru-Hole, Vertical, Heatsink Mounted; 3 In-Line Leads; Pitch 2.54 mm)
footprint my_7805
pins: 1 G, 2 D, 3 S

## IRF7313
designator Q?
HEXFET Power MOSFET; Published: 8-Jun-2000; LatestRevisionDate: 13-Apr-2006; LatestRevisionNote: IPC-7351 Footprint Added.; DatasheetVersion: Aug-1997; PackageVersion: Feb-2001; PackageReference: SO-8; Publisher: Altium Limited; PackageDescription: 8-Pin Plastic Small Outline Integrated Circuit 1.27 mm Pitch; Code_JEDEC: MS-012-AA; Code_IPC: SOIC127P600-8; ComponentLink1Description: Manufacturer Link; ComponentLink1URL: http://www.irf.com/; ComponentLink2Description: Datasheet; ComponentLink2URL: http://www.irf.com/product-info/datasheets/data/irf7313.pdf
footprint SO-8_M (SOIC, 8-Leads, Body 4.9x3.9mm, Pitch 1.27mm, IPC Low Density)
part A pins: 1 S, 2 G, 7 D, 8 D
part B pins: 3 S, 4 G, 5 D, 6 D
part A text: 7, 8
part B text: 5, 6

## IRF8736
designator Q?
Synchronous Rectifier MOSFET for  Isolated DC-DC Converters; Published: 8-Jun-2000; LatestRevisionDate: 13-Apr-2006; LatestRevisionNote: IPC-7351 Footprint Added.; DatasheetVersion: 6-Oct-1997; PackageVersion: Aug-1998; PackageReference: SO-8; Publisher: Altium Limited; PackageDescription: 8-Pin Small Outline Integrated Circuit 1.27 mm Pitch; ComponentLink1Description: Manufacturer Link; ComponentLink1URL: http://www.vishay.com/; ComponentLink2Description: Datasheet; ComponentLink2URL: http://www.vishay.com/docs/70154/70154.pdf
footprint SO-8_N (SOIC, 8-Leads, Body 4.9x3.9mm, Pitch 1.27mm, IPC Medium Density)
footprint SO-8_L (SOIC, 8-Leads, Body 4.9x3.9mm, Pitch 1.27mm, IPC High Density)
footprint SO-8_M (SOIC, 8-Leads, Body 4.9x3.9mm, Pitch 1.27mm, IPC Low Density)
3D model SO-8 (8-Pin Small Outline Integrated Circuit 1.27 mm Pitch)
pins: 1 S, 2 S, 3 S, 4 G, 5 D, 6 D, 7 D, 8 D
text: 5, 6, 7, 8; 1, 2, 3

## IRF9630
designator F?
TO PACKAGE
footprint my_7805
pins: 1 G, 2 D, 3 S

## J175
designator J?
footprint my_tr
pins: 1 D, 2 S, 3 G

## JOYSTICK N73
designator J?
footprint MY_JOY STICK_N73
pins: 1 U, 3 C, 4 R, 5 L, 6 D, Com C

## Joystick Nokia 6600
designator J?
Joystick keypad
footprint MY_6600_Joystick
pins: C, Com C, D, L, R, Shild, U

## Jumper
designator W?
Jumper WITH 2PIN MAILE AND NORMAL JUMPER 2 PIN; Manufacturer: Generic Components; Published: 1999
footprint My_IDC-2
footprint Jumper SMD - Small
pins: 1 C1, 2 C2

## K9XXG08UXA
designator U?
512M x 8 Bit / 1G x 8 Bit NAND Flash Memory; Flash: 512MB
footprint TSOP48 (48-Pin Thin Small Outline Package 0.5 mm Pitch (VO48))
pins: 7 R/~{B} (out), 8 ~{RE} (in), 9 ~{CE} (in), 12 3.3V (power), 13 VSS (power), 16 CLE (in), 17 ALE (in), 18 ~{WE} (in), 19 ~{WP} (in), 29 I/O0 (io), 30 I/O1 (io), 31 I/O2 (io), 32 I/O3 (io), 36 VSS (power), 37 VCC (power), 41 I/O4 (io), 42 I/O5 (io), 43 I/O6 (io), 44 I/O7 (io)

## KBD 4*4
designator kbd?
16 PCS 4PIN TAC SWITCH SMALL
footprint MY_KBD
footprint MY_KBD - duplicate
pins: C1 (out), C2 (out), C3 (out), C4 (out), R1 (in), R2 (in), R3 (in), R4 (in)
text: 4*4 Matrix

## Keyboard Matrix 4x4
designator KBD?, comment Keyboard
Designer: Saeid Jorablo; Company: Personal; Project Name: Abtahi; Adding Date: 10/21/2009
footprint Keyboard (Matrix Keyboard 4x4)
pins: 1 R1, 2 R2, 3 R3, 4 R4, 5 C1, 6 C2, 7 C3, 8 C4, 9 V, 10 LED1, 11 LED2, 12 LED3, 13 LED4, 14 CLED

## LCD
designator LCD?, comment 20x4  (value not drawn)
Designer: Saeid Jorablo; Company: My self; Adding Date: 10/21/2009; LCDType: 20x4
footprint LCD 20x4
footprint LCD 16x2 (Character LCD, 2 Row, 16 Colunm)
footprint LCD2*20
footprint LCD 2*8
footprint LCD2*16_VERTICAL
pins: 1 GND, 2 VCC, 3 V0, 4 RS, 5 R/~{W}, 6 EN, 7 DB0, 8 DB1, 9 DB2, 10 DB3, 11 DB4, 12 DB5, 13 DB6, 14 DB7, 15 BLA, 16 BLK, MH

## LCD64x128 ks108
designator LCD?, comment LCD 128X64  (value not drawn)
Graphic LCD with KS108 Controller
footprint my_glcd_ks108
pins: 1 GND (in), 2 vcc (in), 3 VO (power), 4 RS (power), 5 WR (power), 6 E (in), 7 D0 (oc), 8 D1 (oc), 9 D2 (oc), 10 D3 (oc), 11 D4 (oc), 12 D5 (oc), 13 D6 (oc), 14 D7 (oc), 15 CS1 (oc), 16 CS2 (oc), 17 RST (oc), 18 VEE (oc), 19 A (oc), 20 K (oc)
text: GLCD 64X128

## LCD128x64
designator LCD?, comment LCD 128X64  (value not drawn)
Graphic LCD with KS108 Controller
footprint My_LCD128x64
pins: 1 CSA (in), 2 CSB (in), 3 GND (power), 4 VCC (power), 5 VEE (power), 6 D/I (in), 7 R/W (in), 8 E (in), 9 DB0 (io), 10 DB1 (io), 11 DB2 (io), 12 DB3 (io), 13 DB4 (io), 14 DB5 (io), 15 DB6 (io), 16 DB7 (io), 17 A, 18 K
text: GLCD 128X64

## LCD128x128 T6963
designator LCD?, comment LCD 128X64  (value not drawn)
Graphic LCD with KS108 Controller
footprint My_LCD128x64
pins: 1 F GND (in), 2 GND (in), 3 VCC (power), 4 VO (power), 5 WR (power), 6 RD (in), 7 CE (in), 8 CD (in), 9 NC (io), 10 RST (io), 11 DB0 (io), 12 DB1 (io), 13 DB2 (io), 14 DB3 (io), 15 DB4 (io), 16 DB5 (io), 17 DB6 (io), 18 DB7 (io), 19 FS (io), 20 NC (io)
text: GLCD 128X128

## LCD 8X2
designator LCD?, comment LCD
footprint LCD 2*8
pins: 1 GND (power), 2 VCC (power), 3 VO, 4 RS (in), 5 R/W (in), 6 E (in), 7 DB0 (io), 8 DB1 (io), 9 DB2 (io), 10 DB3 (io), 11 DB4 (io), 12 DB5 (io), 13 DB6 (io), 14 DB7 (io), 15 A, 16 K
